# Altium footprint library TRANS_POWER.PcbLib: 26 footprints (part 2 of 2)
Each footprint in its own frame and in the unit in brackets; x right, y up, seen from the top. Pads: shape width x height; smd on the part's side, far side on the other; paste and mask are expansions set on the pad; w line width, h text height; cw(c..) or ccw(c..) is an arc to the next point about the centre after c.
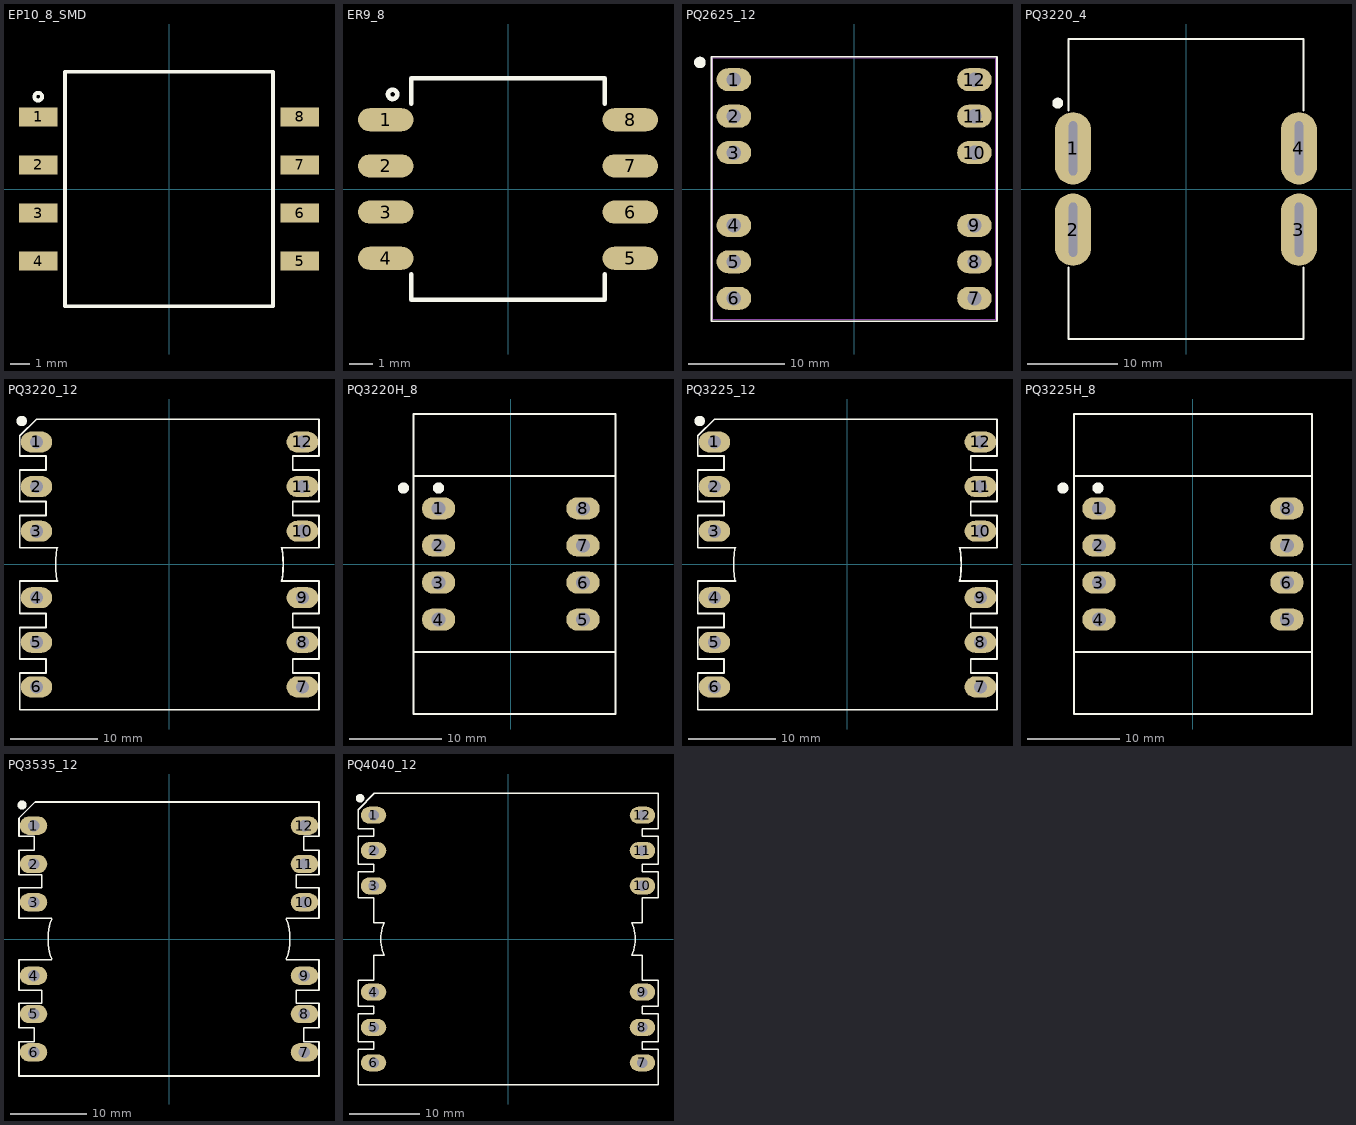
[diagram p1: the footprints below, top view; thin cyan lines are the x and y axes]

## EP10_8_SMD [mm] "TRANS, EP10 4+4, Pitch 2.54mm"
height 10
pads (8):
  rect 2x1 smd paste-0.2: 1(-6.8,3.75) 2(-6.8,1.25) 3(-6.8,-1.25) 4(-6.8,-3.75) 5(6.8,-3.75) 6(6.8,-1.25) 7(6.8,1.25) 8(6.8,3.75)
Top Overlay:
  circle w0.2: c-6.8,4.8 r0.2
  lines w0.2: -5.4,-6.1 -5.4,6.1 5.4,6.1 5.4,-6.1 -5.4,-6.1
3D body "ep10_070-6052 (rev1).STEP": height 10.78, standoff 0, extent -7.32,-6.065 7.3,6.065

## ER9_8 [mm] "TRANS, ER9.5/5  9.5X5mm, pitch: 3.75mm"
height 4
pads (8):
  oval 2.4x1 smd: 1(-5.3,3) 2(-5.3,1) 3(-5.3,-1) 4(-5.3,-3) 5(5.3,-3) 6(5.3,-1) 7(5.3,1) 8(5.3,3)
Top Overlay:
  circle w0.2: c-5,4.1 r0.2
  lines w0.2: -4.2,-3.7 -4.2,-4.8 4.2,-4.8 4.2,-3.7 ; -4.2,3.7 -4.2,4.8 4.2,4.8 4.2,3.7
3D body "ER9_5.STEP": height 5.25, standoff 0, extent -5.8,-4.75 5.8,4.75

## PQ2625_12 [mm] "TRANS, PQ26/25_6+6  core size 26X19X25mm, pitch: 5.08mm"
height 35
pads (12):
  oval 3.6x2.4 hole 1.5: 1(-12.55,11.4) 2(-12.55,7.6) 3(-12.55,3.8) 4(-12.55,-3.8) 5(-12.55,-7.6) 6(-12.55,-11.4) 7(12.55,-11.4) 8(12.55,-7.6) 9(12.55,-3.8) 10(12.55,3.8) 11(12.55,7.6) 12(12.55,11.4)
Top Overlay:
  circle w0.6: c-16.1,13.2 r0.3
  lines w0.2: -14.9,-13.8 -14.9,13.8 14.9,13.8 14.9,-13.8 -14.9,-13.8
Mechanical 13:
  lines w0.1: -14.75,-13.6 14.75,-13.6 14.75,13.7 -14.75,13.7 -14.75,-13.6
3D body "PQ-26-25_6+6_tx.stp": height 25.21, standoff -6.41, extent -14.75,-13.6 14.75,13.7

## PQ3220_4 [mm] "TRANS, PQ32/20_2+2, core size 32X20X22mm"
height 35
pads (4):
  oval 4x8 hole 0.9 slot 6 at 90 deg: 1(-12.5,4.5) 2(-12.5,-4.5) 3(12.5,-4.5) 4(12.5,4.5)
Top Overlay:
  circle w0.6: c-14.2,9.5 r0.3
  lines w0.2: -13,-8.7 -13,-16.6 13,-16.6 13,-8.7 ; -13,8.7 -13,16.6 13,16.6 13,8.7
3D body "PQ3220.STEP": height 20.6, standoff -1.84, extent -12.778,-16.5 12.898,16.5

## PQ3220_12 [mm] "TRANS, PQ32/20_6+6  core size 32X20X22mm, pitch: 5.08mm"
height 35
pads (12):
  oval 3.6x2.4 hole 1.5: 1(-15.2,14) 2(-15.2,8.9) 3(-15.2,3.8) 4(-15.2,-3.8) 5(-15.2,-8.9) 6(-15.2,-14) 7(15.2,-14) 8(15.2,-8.9) 9(15.2,-3.8) 10(15.2,3.8) 11(15.2,8.9) 12(15.2,14)
Top Overlay:
  circle w0.6: c-16.9,16.4 r0.3
  lines w0.2: -12.873,-1.809 cw(c0,0) -12.873,1.809 ; -12.8,-1.9 -17.1,-1.9 -17.1,-5.6 -14.1,-5.6 -14.1,-7.2 -17.1,-7.2 -17.1,-10.8 -14.1,-10.8 -14.1,-12.4 -17.1,-12.4 ; -12.8,1.9 -17.1,1.9 -17.1,5.6 -14.1,5.6 -14.1,7.2 -17.1,7.2 -17.1,10.8 -14.1,10.8 -14.1,12.4 -17.1,12.4 -17.1,14.7 -15.2,16.6 17.1,16.6 ; 12.8,-1.9 17.1,-1.9 17.1,-5.6 14.1,-5.6 14.1,-7.2 17.1,-7.2 17.1,-10.8 14.1,-10.8 14.1,-12.4 17.1,-12.4 ; 12.8,1.9 17.1,1.9 17.1,5.6 14.1,5.6 14.1,7.2 17.1,7.2 17.1,10.8 14.1,10.8 14.1,12.4 17.1,12.4 17.1,16.6 ; 12.873,-1.809 ccw(c0,0) 12.873,1.809 ; -17.1,-12.4 -17.1,-12.4 ; -17.1,-12.4 -17.1,-16.6 17.1,-16.6 17.1,-12.4 ; 17.1,-12.4 17.1,-12.4 ; 17.1,16.6 17.1,16.6
3D body "User Library-Transformer PQ3220.STEP": height 22.8, standoff -5.3, extent -17,-16.5 17,16.5

## PQ3220H_8 [mm] "TRANS, PQ32/20_4+4  core size 32X20X22mm, pitch: 4mm"
pads (8):
  oval 3.6x2.4 hole 1.5: 1(-7.8,6) 2(-7.8,2) 3(-7.8,-2) 4(-7.8,-6) 5(7.8,-6) 6(7.8,-2) 7(7.8,2) 8(7.8,6)
Top Overlay:
  circle w0.6: c-7.8,8.2 r0.3
  circle w0.6: c-11.6,8.2 r0.3
  lines w0.2: -10.5,-9.5 11.3,-9.5 ; -10.5,9.5 11.3,9.5 ; -10.5,-16.2 11.3,-16.2 11.3,16.2 -10.5,16.2 -10.5,-16.2
3D body "User Library-PQ3220H 4+4Pin.step": height 29.98, standoff -4.12, extent -10.4,-16.075 11.175,16.075

## PQ3225_12 [mm] "TRANS, PQ32/25_6+6  core size 33X22X16mm, pitch: 5.08mm, FERROXCUBE"
height 35
pads (12):
  oval 3.6x2.4 hole 1.5: 1(-15.2,14) 2(-15.2,8.9) 3(-15.2,3.8) 4(-15.2,-3.8) 5(-15.2,-8.9) 6(-15.2,-14) 7(15.2,-14) 8(15.2,-8.9) 9(15.2,-3.8) 10(15.2,3.8) 11(15.2,8.9) 12(15.2,14)
Top Overlay:
  circle w0.6: c-16.9,16.4 r0.3
  lines w0.2: -12.873,-1.809 cw(c0,0) -12.873,1.809 ; -12.8,-1.9 -17.1,-1.9 -17.1,-5.6 -14.1,-5.6 -14.1,-7.2 -17.1,-7.2 -17.1,-10.8 -14.1,-10.8 -14.1,-12.4 -17.1,-12.4 ; -12.8,1.9 -17.1,1.9 -17.1,5.6 -14.1,5.6 -14.1,7.2 -17.1,7.2 -17.1,10.8 -14.1,10.8 -14.1,12.4 -17.1,12.4 -17.1,14.7 -15.2,16.6 17.1,16.6 ; 12.8,-1.9 17.1,-1.9 17.1,-5.6 14.1,-5.6 14.1,-7.2 17.1,-7.2 17.1,-10.8 14.1,-10.8 14.1,-12.4 17.1,-12.4 ; 12.8,1.9 17.1,1.9 17.1,5.6 14.1,5.6 14.1,7.2 17.1,7.2 17.1,10.8 14.1,10.8 14.1,12.4 17.1,12.4 17.1,16.6 ; 12.873,-1.809 ccw(c0,0) 12.873,1.809 ; -17.1,-12.4 -17.1,-16.6 17.1,-16.6 17.1,-12.4 ; -17.1,-12.4 -17.1,-12.4 ; 17.1,-12.4 17.1,-12.4 ; 17.1,16.6 17.1,16.6
3D body "User Library-Transformer PQ3225.STEP": height 27.8, standoff -5.3, extent -17,-16.5 17,16.5

## PQ3225H_8 [mm] "TRANS, PQ32/25_4+4  core size 33X22X16mm, pitch: 4mm, FERROXCUBE"
pads (8):
  oval 3.6x2.4 hole 1.5: 1(-10.15,6) 2(-10.15,2) 3(-10.15,-2) 4(-10.15,-6) 5(10.15,-6) 6(10.15,-2) 7(10.15,2) 8(10.15,6)
Top Overlay:
  circle w0.6: c-14.05,8.2 r0.3
  circle w0.6: c-10.25,8.2 r0.3
  lines w0.2: -12.85,-9.5 12.85,-9.5 ; -12.85,9.5 12.85,9.5 ; -12.85,-16.2 -12.85,16.2 12.85,16.2 12.85,-16.2 -12.85,-16.2
3D body "PQ3225H 4+4Pin.STEP": height 30, standoff -3.22, extent -12.75,-16.1 12.75,16.1

## PQ3535_12 [mm] "TRANS, PQ35/35_6+6  35X35X26mm, pitch: 5.08mm"
height 35
pads (12):
  oval 3.6x2.4 hole 1.5: 1(-17.7,14.8) 2(-17.7,9.8) 3(-17.7,4.8) 4(-17.7,-4.8) 5(-17.7,-9.8) 6(-17.7,-14.8) 7(17.7,-14.8) 8(17.7,-9.8) 9(17.7,-4.8) 10(17.7,4.8) 11(17.7,9.8) 12(17.7,14.8)
Top Overlay:
  circle w0.6: c-19.2,17.5 r0.3
  lines w0.2: -15.348,-2.565 cw(c-8.3,0) -15.348,2.565 ; -15.3,-2.7 -19.6,-2.7 -19.6,-6.7 -16.6,-6.7 -16.6,-8.4 -19.6,-8.4 -19.6,-11.6 -17.6,-11.6 -17.6,-13.4 -19.6,-13.4 -19.6,-17.9 19.6,-17.9 19.6,-13.4 17.6,-13.4 17.6,-11.6 19.6,-11.6 19.6,-8.4 16.6,-8.4 16.6,-6.7 19.6,-6.7 19.6,-2.7 15.3,-2.7 ; -15.3,2.7 -19.6,2.7 -19.6,6.7 -16.6,6.7 -16.6,8.4 -19.6,8.4 -19.6,11.6 -17.6,11.6 -17.6,13.4 -19.6,13.4 -19.6,15.8 -17.5,17.9 19.6,17.9 19.6,13.4 17.6,13.4 17.6,11.6 19.6,11.6 19.6,8.4 16.6,8.4 16.6,6.7 19.6,6.7 19.6,2.7 15.3,2.7 ; 15.348,-2.565 ccw(c8.3,0) 15.348,2.565
3D body "PQ3535(6+6).step": height 37.75, standoff -4, extent -19.5,-17.75 19.5,17.75

## PQ4040_12 [mm] "TRANS, PQ40/40_6+6  40X40X28mm, pitch: 5.08mm"
height 40
pads (12):
  oval 3.6x2.4 hole 1.5: 1(-19,17.5) 2(-19,12.5) 3(-19,7.5) 4(-19,-7.5) 5(-19,-12.5) 6(-19,-17.5) 7(19,-17.5) 8(19,-12.5) 9(19,-7.5) 10(19,7.5) 11(19,12.5) 12(19,17.5)
Top Overlay:
  circle w0.6: c-20.9,19.9 r0.3
  lines w0.2: -17.5,-2.3 -19,-2.3 -19,-5.8 -21.2,-5.8 -21.2,-9.5 -19,-9.5 -19,-10.6 -21.2,-10.6 -21.2,-14.5 -19,-14.5 -19,-15.6 -21.2,-15.6 -21.2,-20.6 21.2,-20.6 21.2,-15.6 19,-15.6 19,-14.5 21.2,-14.5 21.2,-10.6 19,-10.6 19,-9.5 21.2,-9.5 21.2,-5.8 19,-5.8 19,-2.3 17.5,-2.3 ; -17.5,2.3 -19,2.3 -19,5.8 -21.2,5.8 -21.2,9.5 -19,9.5 -19,10.6 -21.2,10.6 -21.2,14.5 -19,14.5 -19,15.6 -21.2,15.6 -21.2,18.3 -18.9,20.6 21.2,20.6 21.2,15.6 19,15.6 19,14.5 21.2,14.5 21.2,10.6 19,10.6 19,9.5 21.2,9.5 21.2,5.8 19,5.8 19,2.3 17.5,2.3 ; -17.485,-2.324 cw(c-12.5,0) -17.485,2.324 ; 17.485,-2.324 ccw(c12.5,0) 17.485,2.324
3D body "PQ4040(6+6).step": height 44.05, standoff -4, extent -21.1,-20.45 21.1,20.45